# Altium footprint library Library.PcbLib: 308 footprints (part 11 of 21)
Each footprint in its own frame and in the unit in brackets; x right, y up, seen from the top. Pads: shape width x height; smd on the part's side, far side on the other; paste and mask are expansions set on the pad; w line width, h text height; cw(c..) or ccw(c..) is an arc to the next point about the centre after c.
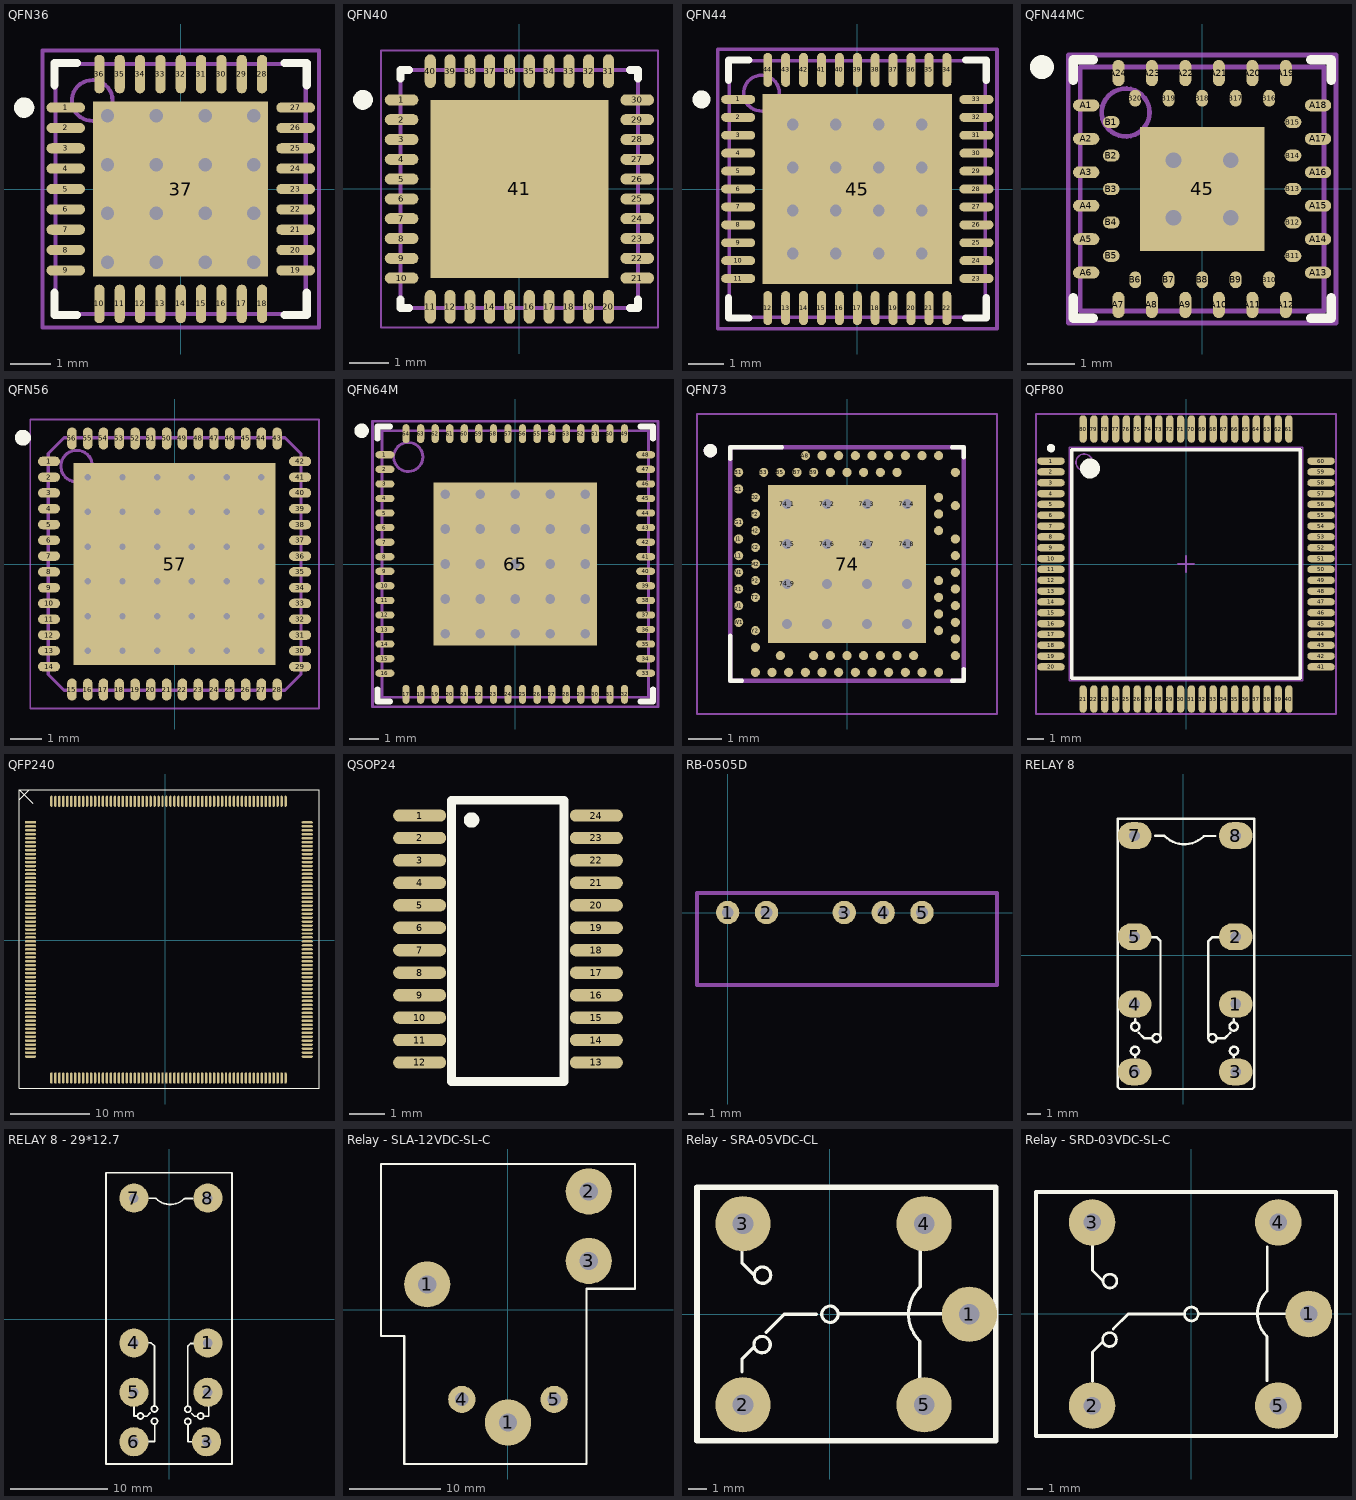
[diagram p10: the footprints below, top view; thin cyan lines are the x and y axes]

## QFN36 [mm] "QFN, 36-Leads, Body 6x6mm, Pitch 0.5mm, IPC High Density"
height 1
pads (37):
  oval 0.95x0.25 smd: 1(-2.825,2) 2(-2.825,1.5) 3(-2.825,1) 4(-2.825,0.5) 5(-2.825,0) 6(-2.825,-0.5) 7(-2.825,-1) 8(-2.825,-1.5) 9(-2.825,-2) 19(2.825,-2) 20(2.825,-1.5) 21(2.825,-1) 22(2.825,-0.5) 23(2.825,0) 24(2.825,0.5) 25(2.825,1) 26(2.825,1.5) 27(2.825,2)
  oval 0.25x0.95 smd: 10(-2,-2.825) 11(-1.5,-2.825) 12(-1,-2.825) 13(-0.5,-2.825) 14(0,-2.825) 15(0.5,-2.825) 16(1,-2.825) 17(1.5,-2.825) 18(2,-2.825) 28(2,2.825) 29(1.5,2.825) 30(1,2.825) 31(0.5,2.825) 32(0,2.825) 33(-0.5,2.825) 34(-1,2.825) 35(-1.5,2.825) 36(-2,2.825)
  rect 4.3x4.3 smd: 37(0,0)
via -1.8,1.8 diameter 0.66 hole 0.33
via -0.6,1.8 diameter 0.66 hole 0.33
via 0.6,1.8 diameter 0.66 hole 0.33
via 1.8,1.8 diameter 0.66 hole 0.33
via -1.8,0.6 diameter 0.66 hole 0.33
via -0.6,0.6 diameter 0.66 hole 0.33
via 0.6,0.6 diameter 0.66 hole 0.33
via 1.8,0.6 diameter 0.66 hole 0.33
via -1.8,-0.6 diameter 0.66 hole 0.33
via -0.6,-0.6 diameter 0.66 hole 0.33
via 0.6,-0.6 diameter 0.66 hole 0.33
via 1.8,-0.6 diameter 0.66 hole 0.33
via -1.8,-1.8 diameter 0.66 hole 0.33
via -0.6,-1.8 diameter 0.66 hole 0.33
via 0.6,-1.8 diameter 0.66 hole 0.33
via 1.8,-1.8 diameter 0.66 hole 0.33
Top Overlay:
  circle w0.25: c-3.85,2 r0.125
  lines w0.2: -3.1,-2.55 -3.1,-3.1 -2.55,-3.1 ; -3.1,2.55 -3.1,3.1 -2.55,3.1 ; 2.55,-3.1 3.1,-3.1 3.1,-2.55 ; 2.55,3.1 3.1,3.1 3.1,2.55
Mechanical 13:
  circle w0.1: c-2.175,2.175 r0.5
  lines w0.1: -3.075,-3.075 -3.075,3.075 3.075,3.075 3.075,-3.075 -3.075,-3.075
Mechanical 15:
  lines w0.1: -0.5,0 0.5,0 ; 0,-0.5 0,0.5 ; -3.4,-3.4 -3.4,3.4 3.4,3.4 3.4,-3.4 -3.4,-3.4
3D body "User Library-QFN36 (6x6).step": height 0.9, standoff 0.01, extent -3.102,-3.103 3.103,3.102

## QFN40 [mm] "QFN, 40-Leads, Body 6x6mm, Pitch 0.5mm, Thermal Pad 4.5x4.5mm"
height 1
pads (41):
  oval 0.85x0.28 smd: 1(-2.975,2.25) 2(-2.975,1.75) 3(-2.975,1.25) 4(-2.975,0.75) 5(-2.975,0.25) 6(-2.975,-0.25) 7(-2.975,-0.75) 8(-2.975,-1.25) 9(-2.975,-1.75) 10(-2.975,-2.25) 21(2.975,-2.25) 22(2.975,-1.75) 23(2.975,-1.25) 24(2.975,-0.75) 25(2.975,-0.25) 26(2.975,0.25) 27(2.975,0.75) 28(2.975,1.25) 29(2.975,1.75) 30(2.975,2.25)
  oval 0.28x0.85 smd: 11(-2.25,-2.975) 12(-1.75,-2.975) 13(-1.25,-2.975) 14(-0.75,-2.975) 15(-0.25,-2.975) 16(0.25,-2.975) 17(0.75,-2.975) 18(1.25,-2.975) 19(1.75,-2.975) 20(2.25,-2.975) 31(2.25,2.975) 32(1.75,2.975) 33(1.25,2.975) 34(0.75,2.975) 35(0.25,2.975) 36(-0.25,2.975) 37(-0.75,2.975) 38(-1.25,2.975) 39(-1.75,2.975) 40(-2.25,2.975)
  rect 4.5x4.5 smd: 41(0,0)
Top Overlay:
  circle w0.25: c-3.95,2.25 r0.125
  lines w0.2: -3,-2.79 -3,-3 -2.79,-3 ; -3,2.79 -3,3 -2.79,3 ; 2.79,-3 3,-3 3,-2.79 ; 2.79,3 3,3 3,2.79
Mechanical 13:
  lines w0.1: -3,-3 -3,3 3,3 3,-3 -3,-3
Mechanical 15:
  lines w0.05: -3.5,-3.5 -3.5,3.5 3.5,3.5 3.5,-3.5 -3.5,-3.5
  lines w0.1: -0.5,0 0.5,0 ; 0,-0.5 0,0.5
3D body "User Library-QFN40 (6x6).step": height 0.9, standoff 0, extent -3,-3 3,3

## QFN44 [mm] "QFN, 44-Leads, Body 7x7mm, Pitch 0.5mm, IPC High Density"
height 1
pads (45):
  oval 0.95x0.25 smd: 1(-3.325,2.5) 2(-3.325,2) 3(-3.325,1.5) 4(-3.325,1) 5(-3.325,0.5) 6(-3.325,0) 7(-3.325,-0.5) 8(-3.325,-1) 9(-3.325,-1.5) 10(-3.325,-2) 11(-3.325,-2.5) 23(3.325,-2.5) 24(3.325,-2) 25(3.325,-1.5) 26(3.325,-1) 27(3.325,-0.5) 28(3.325,0) 29(3.325,0.5) 30(3.325,1) 31(3.325,1.5) 32(3.325,2) 33(3.325,2.5)
  oval 0.25x0.95 smd: 12(-2.5,-3.325) 13(-2,-3.325) 14(-1.5,-3.325) 15(-1,-3.325) 16(-0.5,-3.325) 17(0,-3.325) 18(0.5,-3.325) 19(1,-3.325) 20(1.5,-3.325) 21(2,-3.325) 22(2.5,-3.325) 34(2.5,3.325) 35(2,3.325) 36(1.5,3.325) 37(1,3.325) 38(0.5,3.325) 39(0,3.325) 40(-0.5,3.325) 41(-1,3.325) 42(-1.5,3.325) 43(-2,3.325) 44(-2.5,3.325)
  rect 5.3x5.3 smd: 45(0,0)
via 1.8,-1.8 diameter 0.66 hole 0.33
via 0.6,-1.8 diameter 0.66 hole 0.33
via -0.6,-1.8 diameter 0.66 hole 0.33
via -1.8,-1.8 diameter 0.66 hole 0.33
via 1.8,-0.6 diameter 0.66 hole 0.33
via 0.6,-0.6 diameter 0.66 hole 0.33
via -0.6,-0.6 diameter 0.66 hole 0.33
via -1.8,-0.6 diameter 0.66 hole 0.33
via 1.8,0.6 diameter 0.66 hole 0.33
via 0.6,0.6 diameter 0.66 hole 0.33
via -0.6,0.6 diameter 0.66 hole 0.33
via -1.8,0.6 diameter 0.66 hole 0.33
via 1.8,1.8 diameter 0.66 hole 0.33
via 0.6,1.8 diameter 0.66 hole 0.33
via -0.6,1.8 diameter 0.66 hole 0.33
via -1.8,1.8 diameter 0.66 hole 0.33
Top Overlay:
  circle w0.25: c-4.35,2.5 r0.125
  lines w0.2: -3.6,-3.025 -3.6,-3.6 -3.025,-3.6 ; -3.6,3.025 -3.6,3.6 -3.025,3.6 ; 3.025,-3.6 3.6,-3.6 3.6,-3.025 ; 3.025,3.6 3.6,3.6 3.6,3.025
Mechanical 13:
  circle w0.1: c-2.675,2.675 r0.5
  lines w0.1: -3.575,-3.575 3.575,-3.575 3.575,3.575 -3.575,3.575 -3.575,-3.575
Mechanical 15:
  lines w0.1: -0.5,0 0.5,0 ; 0,-0.5 0,0.5 ; -3.9,-3.9 3.9,-3.9 3.9,3.9 -3.9,3.9 -3.9,-3.9
3D body "User Library-smd_qfn-44-2.step": height 0.9, standoff 0, extent -3.501,-3.501 3.501,3.501

## QFN44MC [mm] "QFN, 44-Leads, 2-Rows Staggered, Body 5x5 mm, Pitch 0.7mm"
height 1
pads (45):
  rect 2.6x2.6 smd: 45(0,0)
  oval 0.55x0.25 smd: A1(-2.425,1.75) A2(-2.425,1.05) A3(-2.425,0.35) A4(-2.425,-0.35) A5(-2.425,-1.05) A6(-2.425,-1.75) A13(2.425,-1.75) A14(2.425,-1.05) A15(2.425,-0.35) A16(2.425,0.35) A17(2.425,1.05) A18(2.425,1.75)
  oval 0.25x0.55 smd: A7(-1.75,-2.425) A8(-1.05,-2.425) A9(-0.35,-2.425) A10(0.35,-2.425) A11(1.05,-2.425) A12(1.75,-2.425) A19(1.75,2.425) A20(1.05,2.425) A21(0.35,2.425) A22(-0.35,2.425) A23(-1.05,2.425) A24(-1.75,2.425)
  oval 0.35x0.25 smd: B1(-1.9,1.4) B2(-1.9,0.7) B3(-1.9,0) B4(-1.9,-0.7) B5(-1.9,-1.4) B11(1.9,-1.4) B12(1.9,-0.7) B13(1.9,0) B14(1.9,0.7) B15(1.9,1.4)
  oval 0.25x0.35 smd: B6(-1.4,-1.9) B7(-0.7,-1.9) B8(0,-1.9) B9(0.7,-1.9) B10(1.4,-1.9) B16(1.4,1.9) B17(0.7,1.9) B18(0,1.9) B19(-0.7,1.9) B20(-1.4,1.9)
via -0.6,0.6 diameter 0.66 hole 0.33
via 0.6,0.6 diameter 0.66 hole 0.33
via -0.6,-0.6 diameter 0.66 hole 0.33
via 0.6,-0.6 diameter 0.66 hole 0.33
Top Overlay:
  circle w0.25: c-3.35,2.55 r0.125
  lines w0.2: -2.7,-2.275 -2.7,-2.7 -2.275,-2.7 ; -2.7,2.275 -2.7,2.7 -2.275,2.7 ; 2.275,-2.7 2.7,-2.7 2.7,-2.275 ; 2.275,2.7 2.7,2.7 2.7,2.275
Mechanical 13:
  circle w0.1: c-1.6,1.6 r0.5
  lines w0.1: -2.55,-2.55 -2.55,2.55 2.55,2.55 2.55,-2.55 -2.55,-2.55
Mechanical 15:
  lines w0.1: -0.5,0 0.5,0 ; 0,-0.5 0,0.5 ; -2.8,-2.8 -2.8,2.8 2.8,2.8 2.8,-2.8 -2.8,-2.8
3D body: height 1, standoff 0, extent -2.55,-2.55 2.55,2.55

## QFN56 [mm] "QFN, 56-Leads, Body 8.00x8.00mm, Pitch 0.50mm, Thermal Pad 6.40x6.40mm, IPC Medium Density"
height 1
pads (57):
  oval 0.7x0.3 smd: 1(-3.975,3.25) 2(-3.975,2.75) 3(-3.975,2.25) 4(-3.975,1.75) 5(-3.975,1.25) 6(-3.975,0.75) 7(-3.975,0.25) 8(-3.975,-0.25) 9(-3.975,-0.75) 10(-3.975,-1.25) 11(-3.975,-1.75) 12(-3.975,-2.25) 13(-3.975,-2.75) 14(-3.975,-3.25) 29(3.975,-3.25) 30(3.975,-2.75) 31(3.975,-2.25) 32(3.975,-1.75) 33(3.975,-1.25) 34(3.975,-0.75) 35(3.975,-0.25) 36(3.975,0.25) 37(3.975,0.75) 38(3.975,1.25) 39(3.975,1.75) 40(3.975,2.25) 41(3.975,2.75) 42(3.975,3.25)
  oval 0.3x0.7 smd: 15(-3.25,-3.975) 16(-2.75,-3.975) 17(-2.25,-3.975) 18(-1.75,-3.975) 19(-1.25,-3.975) 20(-0.75,-3.975) 21(-0.25,-3.975) 22(0.25,-3.975) 23(0.75,-3.975) 24(1.25,-3.975) 25(1.75,-3.975) 26(2.25,-3.975) 27(2.75,-3.975) 28(3.25,-3.975) 43(3.25,3.975) 44(2.75,3.975) 45(2.25,3.975) 46(1.75,3.975) 47(1.25,3.975) 48(0.75,3.975) 49(0.25,3.975) 50(-0.25,3.975) 51(-0.75,3.975) 52(-1.25,3.975) 53(-1.75,3.975) 54(-2.25,3.975) 55(-2.75,3.975) 56(-3.25,3.975)
  rect 6.4x6.4 smd: 57(0,0)
via 2.75,-2.75 diameter 0.5 hole 0.2
via 1.65,-2.75 diameter 0.5 hole 0.2
via 0.55,-2.75 diameter 0.5 hole 0.2
via -0.55,-2.75 diameter 0.5 hole 0.2
via -1.65,-2.75 diameter 0.5 hole 0.2
via -2.75,-2.75 diameter 0.5 hole 0.2
via 2.75,-1.65 diameter 0.5 hole 0.2
via 1.65,-1.65 diameter 0.5 hole 0.2
via 0.55,-1.65 diameter 0.5 hole 0.2
via -0.55,-1.65 diameter 0.5 hole 0.2
via -1.65,-1.65 diameter 0.5 hole 0.2
via -2.75,-1.65 diameter 0.5 hole 0.2
via 2.75,-0.55 diameter 0.5 hole 0.2
via 1.65,-0.55 diameter 0.5 hole 0.2
via 0.55,-0.55 diameter 0.5 hole 0.2
via -0.55,-0.55 diameter 0.5 hole 0.2
via -1.65,-0.55 diameter 0.5 hole 0.2
via -2.75,-0.55 diameter 0.5 hole 0.2
via 2.75,0.55 diameter 0.5 hole 0.2
via 1.65,0.55 diameter 0.5 hole 0.2
via 0.55,0.55 diameter 0.5 hole 0.2
via -0.55,0.55 diameter 0.5 hole 0.2
via -1.65,0.55 diameter 0.5 hole 0.2
via -2.75,0.55 diameter 0.5 hole 0.2
via 2.75,1.65 diameter 0.5 hole 0.2
via 1.65,1.65 diameter 0.5 hole 0.2
via 0.55,1.65 diameter 0.5 hole 0.2
via -0.55,1.65 diameter 0.5 hole 0.2
via -1.65,1.65 diameter 0.5 hole 0.2
via -2.75,1.65 diameter 0.5 hole 0.2
via 2.75,2.75 diameter 0.5 hole 0.2
via 1.65,2.75 diameter 0.5 hole 0.2
via 0.55,2.75 diameter 0.5 hole 0.2
via -0.55,2.75 diameter 0.5 hole 0.2
via -1.65,2.75 diameter 0.5 hole 0.2
via -2.75,2.75 diameter 0.5 hole 0.2
Top Overlay:
  circle w0.25: c-4.8,4 r0.125
Mechanical 13:
  circle w0.1: c-3.1,3.1 r0.5
  lines w0.1: -4,-3.5 -4,3.5 -3.5,4 3.5,4 4,3.5 4,-3.5 3.5,-4 -3.5,-4 -4,-3.5
Mechanical 15:
  lines w0.05: -4.575,-4.575 4.575,-4.575 4.575,4.575 -4.575,4.575 -4.575,-4.575
  lines w0.1: -0.5,0 0.5,0 ; 0,-0.5 0,0.5
3D body "User Library-QFN56 (8x8).step": height 0.95, standoff 0, extent -4.015,-4.015 4.015,4.015

## QFN64M [mm] "QFN, 64-Leads, Body 9x9mm, Pitch 0.5mm, IPC High Density"
height 1
pads (65):
  oval 0.65x0.25 smd: 1(-4.475,3.75) 2(-4.475,3.25) 3(-4.475,2.75) 4(-4.475,2.25) 5(-4.475,1.75) 6(-4.475,1.25) 7(-4.475,0.75) 8(-4.475,0.25) 9(-4.475,-0.25) 10(-4.475,-0.75) 11(-4.475,-1.25) 12(-4.475,-1.75) 13(-4.475,-2.25) 14(-4.475,-2.75) 15(-4.475,-3.25) 16(-4.475,-3.75) 33(4.475,-3.75) 34(4.475,-3.25) 35(4.475,-2.75) 36(4.475,-2.25) 37(4.475,-1.75) 38(4.475,-1.25) 39(4.475,-0.75) 40(4.475,-0.25) 41(4.475,0.25) 42(4.475,0.75) 43(4.475,1.25) 44(4.475,1.75) 45(4.475,2.25) 46(4.475,2.75) 47(4.475,3.25) 48(4.475,3.75)
  oval 0.25x0.65 smd: 17(-3.75,-4.475) 18(-3.25,-4.475) 19(-2.75,-4.475) 20(-2.25,-4.475) 21(-1.75,-4.475) 22(-1.25,-4.475) 23(-0.75,-4.475) 24(-0.25,-4.475) 25(0.25,-4.475) 26(0.75,-4.475) 27(1.25,-4.475) 28(1.75,-4.475) 29(2.25,-4.475) 30(2.75,-4.475) 31(3.25,-4.475) 32(3.75,-4.475) 49(3.75,4.475) 50(3.25,4.475) 51(2.75,4.475) 52(2.25,4.475) 53(1.75,4.475) 54(1.25,4.475) 55(0.75,4.475) 56(0.25,4.475) 57(-0.25,4.475) 58(-0.75,4.475) 59(-1.25,4.475) 60(-1.75,4.475) 61(-2.25,4.475) 62(-2.75,4.475) 63(-3.25,4.475) 64(-3.75,4.475)
  rect 5.6x5.6 smd: 65(0,0)
via -2.4,2.4 diameter 0.66 hole 0.33
via -1.2,2.4 diameter 0.66 hole 0.33
via 0,2.4 diameter 0.66 hole 0.33
via 1.2,2.4 diameter 0.66 hole 0.33
via 2.4,2.4 diameter 0.66 hole 0.33
via -2.4,1.2 diameter 0.66 hole 0.33
via -1.2,1.2 diameter 0.66 hole 0.33
via 0,1.2 diameter 0.66 hole 0.33
via 1.2,1.2 diameter 0.66 hole 0.33
via 2.4,1.2 diameter 0.66 hole 0.33
via -2.4,0 diameter 0.66 hole 0.33
via -1.2,0 diameter 0.66 hole 0.33
via 0,0 diameter 0.66 hole 0.33
via 1.2,0 diameter 0.66 hole 0.33
via 2.4,0 diameter 0.66 hole 0.33
via -2.4,-1.2 diameter 0.66 hole 0.33
via -1.2,-1.2 diameter 0.66 hole 0.33
via 0,-1.2 diameter 0.66 hole 0.33
via 1.2,-1.2 diameter 0.66 hole 0.33
via 2.4,-1.2 diameter 0.66 hole 0.33
via -2.4,-2.4 diameter 0.66 hole 0.33
via -1.2,-2.4 diameter 0.66 hole 0.33
via 0,-2.4 diameter 0.66 hole 0.33
via 1.2,-2.4 diameter 0.66 hole 0.33
via 2.4,-2.4 diameter 0.66 hole 0.33
Top Overlay:
  circle w0.25: c-5.275,4.575 r0.125
  lines w0.2: -4.725,-4.3 -4.725,-4.725 -4.3,-4.725 ; -4.725,4.3 -4.725,4.725 -4.3,4.725 ; 4.3,-4.725 4.725,-4.725 4.725,-4.3 ; 4.3,4.725 4.725,4.725 4.725,4.3
Mechanical 13:
  circle w0.1: c-3.675,3.675 r0.5
  lines w0.1: -4.575,-4.575 -4.575,4.575 4.575,4.575 4.575,-4.575 -4.575,-4.575
Mechanical 15:
  lines w0.1: -0.5,0 0.5,0 ; 0,-0.5 0,0.5 ; -4.9,-4.9 -4.9,4.9 4.9,4.9 4.9,-4.9 -4.9,-4.9
3D body "User Library-SiLabs QFN64 (9x9).step": height 0.9, standoff 0, extent -4.5,-4.5 4.5,4.5

## QFN73 [mm]
pads (90):
  rect 4.75x4.75 smd paste-3: 74(0,0)
  round 0.6 hole 0.305 mask+0: 74_1(-1.8,1.8) 74_2(-0.6,1.8) 74_3(0.6,1.8) 74_4(1.8,1.8) 74_5(-1.8,0.6) 74_6(-0.6,0.6) 74_7(0.6,0.6) 74_8(1.8,0.6) 74_9(-1.8,-0.6) 74_10(-0.6,-0.6) 74_11(0.6,-0.6) 74_12(1.8,-0.6) 74_13(-1.8,-1.8) 74_14(-0.6,-1.8) 74_15(0.6,-1.8) 74_16(1.8,-1.8)
  round 0.275 smd: A8(-1.25,3.25) A10(-0.75,3.25) A12(-0.25,3.25) A14(0.25,3.25) A16(0.75,3.25) A18(1.25,3.25) A20(1.75,3.25) A22(2.25,3.25) A23(2.75,3.25) AA24(3.25,-2.25) AB2(-2.75,-2.5) AC5(-2,-2.75) AC9(-1,-2.75) AC11(-0.5,-2.75) AC13(0,-2.75) AC15(0.5,-2.75) AC17(1,-2.75) AC19(1.5,-2.75) AC21(2,-2.75) AC24(3.25,-2.75) AD2(-2.75,-3.25) AD4(-2.25,-3.25) AD6(-1.75,-3.25) AD8(-1.25,-3.25) AD10(-0.75,-3.25) AD12(-0.25,-3.25) AD14(0.25,-3.25) AD16(0.75,-3.25) AD18(1.25,-3.25) AD20(1.75,-3.25) AD22(2.25,-3.25) AD23(2.75,-3.25) B1(-3.25,2.75) B3(-2.5,2.75) B5(-2,2.75) B7(-1.5,2.75) B9(-1,2.75) B11(-0.5,2.75) B13(0,2.75) B15(0.5,2.75) B17(1,2.75) B19(1.5,2.75) B24(3.25,2.75) C1(-3.25,2.25) D2(-2.75,2) D23(2.75,2) E24(3.25,1.75) F2(-2.75,1.5) F23(2.75,1.5) G1(-3.25,1.25) H2(-2.75,1) H23(2.75,1) J1(-3.25,0.75) J24(3.25,0.75) K2(-2.75,0.5) L1(-3.25,0.25) L24(3.25,0.25) M2(-2.75,0) N1(-3.25,-0.25) N24(3.25,-0.25) P2(-2.75,-0.5) P23(2.75,-0.5) R1(-3.25,-0.75) R24(3.25,-0.75) T2(-2.75,-1) T23(2.75,-1) U1(-3.25,-1.25) U24(3.25,-1.25) V23(2.75,-1.5) W1(-3.25,-1.75) W24(3.25,-1.75) Y2(-2.75,-2) Y23(2.75,-2)
Top Overlay:
  circle w0.2: c-4.1,3.4 r0.1
  lines w0.127: -3.5,-2.15 -3.5,-3.5 -3.15,-3.5 ; -3.5,3.15 -3.5,3.5 -1.95,3.5 ; 3.15,-3.5 3.5,-3.5 3.5,-3.15 ; 3.15,3.5 3.5,3.5 3.5,3.2
Top Paste:
  region: 2.075,0.355 0.355,0.355 0.355,2.075 2.075,2.075
  region: -0.355,-2.075 -2.075,-2.075 -2.075,-0.355 -0.355,-0.355
  region: -0.355,0.355 -2.075,0.355 -2.075,2.075 -0.355,2.075
  region: 2.075,-2.075 0.355,-2.075 0.355,-0.355 2.075,-0.355
Mechanical 13:
  circle w0.2: c-4.1,3.4 r0.1
  lines w0.127: -3.5,-3.5 3.5,-3.5 3.5,3.5 -3.5,3.5 -3.5,-3.5
Mechanical 15:
  lines w0.05: -4.5,-4.5 -4.5,4.5 4.5,4.5 4.5,-4.5 -4.5,-4.5
3D body "step_temp.STEP": height 0.85, standoff 0, extent -3.5,-3.5 3.5,3.5

## QFP80 [mm] "QFP, 80-Leads, Body 14 x 14mm, Pitch 0.65mm, IPC High Density"
height 2.45
pads (80):
  oval 1.65x0.45 smd: 1(-8.1,6.175) 2(-8.1,5.525) 3(-8.1,4.875) 4(-8.1,4.225) 5(-8.1,3.575) 6(-8.1,2.925) 7(-8.1,2.275) 8(-8.1,1.625) 9(-8.1,0.975) 10(-8.1,0.325) 11(-8.1,-0.325) 12(-8.1,-0.975) 13(-8.1,-1.625) 14(-8.1,-2.275) 15(-8.1,-2.925) 16(-8.1,-3.575) 17(-8.1,-4.225) 18(-8.1,-4.875) 19(-8.1,-5.525) 20(-8.1,-6.175) 41(8.1,-6.175) 42(8.1,-5.525) 43(8.1,-4.875) 44(8.1,-4.225) 45(8.1,-3.575) 46(8.1,-2.925) 47(8.1,-2.275) 48(8.1,-1.625) 49(8.1,-0.975) 50(8.1,-0.325) 51(8.1,0.325) 52(8.1,0.975) 53(8.1,1.625) 54(8.1,2.275) 55(8.1,2.925) 56(8.1,3.575) 57(8.1,4.225) 58(8.1,4.875) 59(8.1,5.525) 60(8.1,6.175)
  oval 0.45x1.65 smd: 21(-6.175,-8.1) 22(-5.525,-8.1) 23(-4.875,-8.1) 24(-4.225,-8.1) 25(-3.575,-8.1) 26(-2.925,-8.1) 27(-2.275,-8.1) 28(-1.625,-8.1) 29(-0.975,-8.1) 30(-0.325,-8.1) 31(0.325,-8.1) 32(0.975,-8.1) 33(1.625,-8.1) 34(2.275,-8.1) 35(2.925,-8.1) 36(3.575,-8.1) 37(4.225,-8.1) 38(4.875,-8.1) 39(5.525,-8.1) 40(6.175,-8.1) 61(6.175,8.1) 62(5.525,8.1) 63(4.875,8.1) 64(4.225,8.1) 65(3.575,8.1) 66(2.925,8.1) 67(2.275,8.1) 68(1.625,8.1) 69(0.975,8.1) 70(0.325,8.1) 71(-0.325,8.1) 72(-0.975,8.1) 73(-1.625,8.1) 74(-2.275,8.1) 75(-2.925,8.1) 76(-3.575,8.1) 77(-4.225,8.1) 78(-4.875,8.1) 79(-5.525,8.1) 80(-6.175,8.1)
Top Overlay:
  circle w0.6: c-5.762,5.731 r0.3
  circle w0.25: c-8.1,6.95 r0.125
  lines w0.2: -6.85,-6.85 6.85,-6.85 6.85,6.85 -6.85,6.85 -6.85,-6.85
Mechanical 13:
  circle w0.1: c-6.1,6.1 r0.5
  lines w0.1: -7,-7 7,-7 7,7 -7,7 -7,-7
Mechanical 15:
  lines w0.1: -0.5,0 0.5,0 ; 0,-0.5 0,0.5 ; -9,-9 9,-9 9,9 -9,9 -9,-9
3D body "User Library-IPC QFP-full.step": height 1.35, standoff 0, extent -8.018,-8.018 8.018,8.018

## QFP240 [mm]
pads (240):
  rect 1.4x0.31 smd: 1(-16.993,14.859)
  oval 1.4x0.31 smd: 2(-16.993,14.359) 3(-16.993,13.859) 4(-16.993,13.359) 5(-16.993,12.859) 6(-16.993,12.359) 7(-16.993,11.859) 8(-16.993,11.359) 9(-16.993,10.859) 10(-16.993,10.359) 11(-16.993,9.859) 12(-16.993,9.359) 13(-16.993,8.859) 14(-16.993,8.359) 15(-16.993,7.859) 16(-16.993,7.359) 17(-16.993,6.859) 18(-16.993,6.359) 19(-16.993,5.859) 20(-16.993,5.359) 21(-16.993,4.859) 22(-16.993,4.359) 23(-16.993,3.859) 24(-16.993,3.359) 25(-16.993,2.859) 26(-16.993,2.359) 27(-16.993,1.859) 28(-16.993,1.359) 29(-16.993,0.859) 30(-16.993,0.359) 31(-16.993,-0.141) 32(-16.993,-0.641) 33(-16.993,-1.141) 34(-16.993,-1.641) 35(-16.993,-2.141) 36(-16.993,-2.641) 37(-16.993,-3.141) 38(-16.993,-3.641) 39(-16.993,-4.141) 40(-16.993,-4.641) 41(-16.993,-5.141) 42(-16.993,-5.641) 43(-16.993,-6.141) 44(-16.993,-6.641) 45(-16.993,-7.141) 46(-16.993,-7.641) 47(-16.993,-8.141) 48(-16.993,-8.641) 49(-16.993,-9.141) 50(-16.993,-9.641) 51(-16.993,-10.141) 52(-16.993,-10.641) 53(-16.993,-11.141) 54(-16.993,-11.641) 55(-16.993,-12.141) 56(-16.993,-12.641) 57(-16.993,-13.141) 58(-16.993,-13.641) 59(-16.993,-14.141) 60(-16.993,-14.641) 121(17.872,-14.641) 122(17.872,-14.141) 123(17.872,-13.641) 124(17.872,-13.141) 125(17.872,-12.641) 126(17.872,-12.141) 127(17.872,-11.641) 128(17.872,-11.141) 129(17.872,-10.641) 130(17.872,-10.141) 131(17.872,-9.641) 132(17.872,-9.141) 133(17.872,-8.641) 134(17.872,-8.141) 135(17.872,-7.641) 136(17.872,-7.141) 137(17.872,-6.641) 138(17.872,-6.141) 139(17.872,-5.641) 140(17.872,-5.141) 141(17.872,-4.641) 142(17.872,-4.141) 143(17.872,-3.641) 144(17.872,-3.141) 145(17.872,-2.641) 146(17.872,-2.141) 147(17.872,-1.641) 148(17.872,-1.141) 149(17.872,-0.641) 150(17.872,-0.141) 151(17.872,0.359) 152(17.872,0.859) 153(17.872,1.359) 154(17.872,1.859) 155(17.872,2.359) 156(17.872,2.859) 157(17.872,3.359) 158(17.872,3.859) 159(17.872,4.359) 160(17.872,4.859) 161(17.872,5.359) 162(17.872,5.859) 163(17.872,6.359) 164(17.872,6.859) 165(17.872,7.359) 166(17.872,7.859) 167(17.872,8.359) 168(17.872,8.859) 169(17.872,9.359) 170(17.872,9.859) 171(17.872,10.359) 172(17.872,10.859) 173(17.872,11.359) 174(17.872,11.859) 175(17.872,12.359) 176(17.872,12.859) 177(17.872,13.359) 178(17.872,13.859) 179(17.872,14.359) 180(17.872,14.859)
  oval 0.31x1.4 smd: 61(-14.361,-17.349) 62(-13.861,-17.349) 63(-13.361,-17.349) 64(-12.861,-17.349) 65(-12.361,-17.349) 66(-11.861,-17.349) 67(-11.361,-17.349) 68(-10.861,-17.349) 69(-10.361,-17.349) 70(-9.861,-17.349) 71(-9.361,-17.349) 72(-8.861,-17.349) 73(-8.361,-17.349) 74(-7.861,-17.349) 75(-7.361,-17.349) 76(-6.861,-17.349) 77(-6.361,-17.349) 78(-5.861,-17.349) 79(-5.361,-17.349) 80(-4.861,-17.349) 81(-4.361,-17.349) 82(-3.861,-17.349) 83(-3.361,-17.349) 84(-2.861,-17.349) 85(-2.361,-17.349) 86(-1.861,-17.349) 87(-1.361,-17.349) 88(-0.861,-17.349) 89(-0.361,-17.349) 90(0.139,-17.349) 91(0.639,-17.349) 92(1.139,-17.349) 93(1.639,-17.349) 94(2.139,-17.349) 95(2.639,-17.349) 96(3.139,-17.349) 97(3.639,-17.349) 98(4.139,-17.349) 99(4.639,-17.349) 100(5.139,-17.349) 101(5.639,-17.349) 102(6.139,-17.349) 103(6.639,-17.349) 104(7.139,-17.349) 105(7.639,-17.349) 106(8.139,-17.349) 107(8.639,-17.349) 108(9.139,-17.349) 109(9.639,-17.349) 110(10.139,-17.349) 111(10.639,-17.349) 112(11.139,-17.349) 113(11.639,-17.349) 114(12.139,-17.349) 115(12.639,-17.349) 116(13.139,-17.349) 117(13.639,-17.349) 118(14.139,-17.349) 119(14.639,-17.349) 120(15.139,-17.349) 181(15.139,17.516) 182(14.639,17.516) 183(14.139,17.516) 184(13.639,17.516) 185(13.139,17.516) 186(12.639,17.516) 187(12.139,17.516) 188(11.639,17.516) 189(11.139,17.516) 190(10.639,17.516) 191(10.139,17.516) 192(9.639,17.516) 193(9.139,17.516) 194(8.639,17.516) 195(8.139,17.516) 196(7.639,17.516) 197(7.139,17.516) 198(6.639,17.516) 199(6.139,17.516) 200(5.639,17.516) 201(5.139,17.516) 202(4.639,17.516) 203(4.139,17.516) 204(3.639,17.516) 205(3.139,17.516) 206(2.639,17.516) 207(2.139,17.516) 208(1.639,17.516) 209(1.139,17.516) 210(0.639,17.516) 211(0.139,17.516) 212(-0.361,17.516) 213(-0.861,17.516) 214(-1.361,17.516) 215(-1.861,17.516) 216(-2.361,17.516) 217(-2.861,17.516) 218(-3.361,17.516) 219(-3.861,17.516) 220(-4.361,17.516) 221(-4.861,17.516) 222(-5.361,17.516) 223(-5.861,17.516) 224(-6.361,17.516) 225(-6.861,17.516) 226(-7.361,17.516) 227(-7.861,17.516) 228(-8.361,17.516) 229(-8.861,17.516) 230(-9.361,17.516) 231(-9.861,17.516) 232(-10.361,17.516) 233(-10.861,17.516) 234(-11.361,17.516) 235(-11.861,17.516) 236(-12.361,17.516) 237(-12.861,17.516) 238(-13.361,17.516) 239(-13.861,17.516) 240(-14.361,17.516)
Top Overlay:
  lines w0.127: -18.44,17.145 -18.44,17.678 -17.145,18.974 ; -16.739,17.272 -18.44,18.974 ; -18.44,18.974 -18.44,-18.644 19.355,-18.644 19.355,18.974 -18.44,18.974
3D body "User Library-QFP240.step": height 4, standoff 0, extent -16.891,-17.145 17.709,17.455

## QSOP24 [mm]
pads (24):
  oval 1.5x0.35 smd: 1(3.306,109.982) 2(3.306,109.347) 3(3.306,108.712) 4(3.306,108.077) 5(3.306,107.442) 6(3.306,106.807) 7(3.306,106.172) 8(3.306,105.537) 9(3.306,104.902) 10(3.306,104.267) 11(3.306,103.632) 12(3.306,102.997) 13(8.306,102.997) 14(8.306,103.632) 15(8.306,104.267) 16(8.306,104.902) 17(8.306,105.537) 18(8.306,106.172) 19(8.306,106.807) 20(8.306,107.442) 21(8.306,108.077) 22(8.306,108.712) 23(8.306,109.347) 24(8.306,109.982)
Top Overlay:
  circle w0.254: c4.775,109.855 r0.092
  lines w0.254: 4.205,102.464 4.205,110.414 7.391,110.414 7.391,102.464 4.205,102.464
Mechanical 1:

## RB-0505D [mil]
pads (5):
  round 60 hole 30: 1(0,0) 2(100,0) 3(300,0) 4(400,0) 5(500,0)
Mechanical 1:
  lines w10: -78.74,-186.22 692.91,-186.22 692.91,50 -78.74,50 -78.74,-186.22
3D body "rb-0505d.stp": height 407.28, standoff -115.55, extent -78.74,-186.22 692.91,50

## RELAY 8 [mil] "Small"
pads (8):
  oval 100x80 hole 32: 1(155,-145) 2(155,55) 3(155,-346) 4(-145,-145) 5(-145,55) 6(-145,-346) 7(-145,355) 8(155,355)
Top Overlay:
  circle w7: c-144,-283.76 r12.24
  circle w7: c-143,-211.76 r12.24
  circle w7: c-80,-245.76 r12.24
  circle w7: c86,-245.76 r12.24
  circle w7: c149,-211.76 r12.24
  circle w7: c150,-283.76 r12.24
  lines w7: -143,-303 -143,-298 ; -143,-197 -143,-189 ; -133,-230 -117,-246 -94,-246 ; -100,53 -79,53 -68,42 -68,-244 ; -84,355 -57,355 ; -56,354 ccw(c2.5,411.5) 60,353 ; 61,354 94,354 ; 74,-244 74,42 85,53 113,53 ; 100,-246 123,-246 139,-230 ; 149,-303 149,-298 ; 149,-197 149,-189 ; -195,-391 -195,405 210,405 210,-391 204,-397 -189,-397 -195,-391
3D body "SW3dPS-DSY2Y.STEP": height 484.25, standoff -118.11, extent -185,-404.45 200.83,414.45

## RELAY 8 - 29*12.7 [mm]
pads (8):
  round 3 hole 1: 1(4,-2.42) 2(4,-7.5) 3(3.88,-12.605) 4(-3.62,-2.42) 5(-3.62,-7.5) 6(-3.62,-12.605) 7(-3.62,12.5) 8(4,12.5)
Top Overlay:
  circle w0.178: c-1.498,-10.479 r0.311
  circle w0.178: c-2.937,-9.948 r0.311
  circle w0.178: c-1.499,-9.221 r0.311
  circle w0.178: c3.26,-9.948 r0.311
  circle w0.178: c1.943,-10.51 r0.311
  circle w0.178: c1.943,-9.252 r0.311
  lines w0.178: -3.62,-2.42 -1.889,-2.388 -1.499,-2.718 -1.499,-8.911 ; -3.611,-8.136 -3.611,-9.949 -3.247,-9.949 ; -3.569,-11.513 -3.569,-11.386 ; -3.569,-8.82 -3.569,-8.617 ; -3.389,-12.574 -1.475,-12.574 -1.475,-10.789 ; -2.541,-9.961 -2.267,-9.961 -1.927,-9.621 ; -2.071,12.5 -1.385,12.5 ; -1.359,12.475 ccw(c0.126,13.935) 1.587,12.449 ; 1.612,12.475 2.451,12.475 ; 1.943,-8.942 1.943,-2.75 2.222,-2.47 2.933,-2.47 ; 1.966,-10.82 1.966,-12.605 3.88,-12.605 ; 2.34,-9.696 2.626,-9.982 2.951,-9.982 ; 3.585,-9.962 4.106,-9.962 4.106,-8.39 ; 3.848,-11.513 3.848,-11.386 ; 3.848,-8.82 3.848,-8.617 ; -6.5,-14.893 -6.5,15.107 6.5,15.107 6.5,-14.893 -6.5,-14.893
  lines w0.254: -3.611,-8.136 -3.55,-8.136
3D body "User Library-Relay 24VDC 8Pin.STEP": height 15.95, standoff -3.45, extent -6.204,-14.084 6.496,14.916

## Relay - SLA-12VDC-SL-C [mm]
pads (6):
  round 5.08 / inner round 0 / far side round 5.08 hole 2: 1(-8.877,2.773) 1(0.013,-12.427) 2(8.903,13.003) 3(8.903,5.353)
  round 3 / inner round 0 / far side round 3 hole 1.5: 4(-5.067,-9.887) 5(5.093,-9.887)
Top Overlay:
  lines w0.254: -13.957,-2.902 -13.957,16.021 13.983,16.021 13.983,2.305 10.681,2.305 8.649,2.305 8.649,-16.999 -11.417,-16.999 -11.417,-2.902 -13.957,-2.902
3D body "User Library-Releu Songle.step": height 20.26, standoff -3.8, extent -13.5,-16.3 13.5,15.7

## Relay - SRA-05VDC-CL [mil] "15.5 x 12.3 x 14mm"
height 551.18
pads (5):
  round 120 hole 45: 1(302.94,0) 2(-189.15,-196.85) 3(-189.15,196.85) 4(204.52,196.85) 5(204.52,-196.85)
Top Overlay:
  circle w7: c0,0 r17.8
  circle w7: c-147.58,-66 r17.8
  circle w7: c-146.58,85 r17.8
  lines w7: -191.38,-125 -191.38,-98 -165.38,-72 ; -191.38,136.83 -191.38,112 -164.38,85 ; -138.38,-39 -99.38,0 -30,0 ; 20.2,1 253.2,1 ; 194.2,-57 cw(c252.7,0.5) 195.2,59 ; 195.2,-172 195.2,-58 ; 196.2,60 196.2,173
  lines w12: -289.03,-275 360.52,-275 360.52,276.13 -289.03,276.13 -289.03,-275
3D body "Relay - SRA-05VDC-CL.stp": height 102.93, standoff -627.47, extent -274.7,-236 338.3,236

## Relay - SRD-03VDC-SL-C [mil] "19.1 x 15.5 x 15.3mm"
height 602.36
pads (5):
  round 120 hole 45: 1(302.94,0) 2(-256.12,-236.22) 3(-256.12,236.22) 4(224.2,236.22) 5(224.2,-236.22)
Top Overlay:
  circle w7: c-210,85 r17.8
  circle w7: c-211,-66 r17.8
  circle w7: c0,0 r17.8
  lines w7: -254.8,-174 -254.8,-98 -228.8,-72 ; -254.8,178 -254.8,112 -227.8,85 ; -201.8,-39 -162.8,0 -19.8,0 ; 20.2,1 253.2,1 ; 194.2,-57 cw(c252.7,0.5) 195.2,59 ; 195.2,-172 195.2,-58 ; 196.2,60 196.2,173
  lines w10: -400.8,-314.96 373.21,-314.96 373.21,314.96 -400.8,314.96 -400.8,-314.96
3D body "Relay - SRD-03VDC-SL-C.stp": height 588.1, standoff -142.3, extent -384.55,-297 351.45,297